# Altium schematic symbol library BARKO_SCHLIB.SchLib: 1064 symbols (part 8 of 11) (continued)
## Q-FQT2P25TF (continued)
MOSFET P-CH 250V 0.55A SOT-223; Manufacturer: ON Semiconductor / Fairchild; Element Configuration: Single; Drain to Source Breakdown Voltage: -250V; Gate to Source Voltage (Vgs): 30V; Rise Time: 40ns; Rds On Max: 4R; Input Capacitance: 250pF; Current Rating: -550mA; Fall Time: 25ns; Power Dissipation: 2.5W; Turn-Off Delay Time: 12ns; Turn-On Delay Time: 8.5ns; Number of Elements: 1; .Creator: M.OZKAN; .PCBCHK: USED; Supplier 1: Digi-Key; Supplier Part Number 1: FQT2P25TFCT-ND; Manufacturer Part Number: FQT2P25TF; Stock: 2064; Pricing: 1=0.6, 10=0.51, 25=0.4756, 100=0.3533, 250=0.3357, 500=0.2759, 1000=0.2242 (USD); RoHS: Yes; Mount: Surface Mount; Case/Package: SOT-223; Number of Pins: 4; Weight: 0.188g; Min Operating Temperature: -55°C; Max Operating Temperature: 150°C; Package Quantity: 4000; Packaging: Tape and Reel; Voltage Rating (DC): -250V; Drain to Source Resistance: 4R; Max Power Dissipation: 2.5W; Length: 6.7mm; Height: 1.8mm; Width: 3.7mm; Radiation Hardening: No; Lead Free: Lead Free; ComponentLink1URL: https://datasheet.ciiva.com/952/fqt2p25-952984.pdf?src-supplier=Digi-Key; ComponentLink1Description: https://datasheet.ciiva.com/952/fqt2p25-952984.pdf?src-supplier=Digi-Key; ComponentLink2URL: https://datasheet.ciiva.com/29750/fqt2p25-29750954.pdf?src-supplier=Digi-Key; ComponentLink2Description: https://datasheet.ciiva.com/29750/fqt2p25-29750954.pdf?src-supplier=Digi-Key; .SCHCHK: USED
footprint SOT223 (SOT,2.30mm pitch;4 pin,3.50mm W X 6.50mm L X 1.70mm H body)
pins: 1 GATE, 2 DRAIN, 3 SOURCE, 4 DRAIN
text: 2, 4

## Q-IAUA250N04S6N006AUMA1
designator Q?, comment IAUA250N04S6N006AUMA1
40V, N-Ch, 0.6 mΩ max, Automotive MOSFET, sTOLL, OptiMOS™-6; Manufacturer: Infineon; Supplier 1: Mouser; Supplier Part Number 1: 726-IAUA250N04S6N006; Manufacturer Part Number: IAUA250N04S6N006AUMA1; Stock: 1700; Pricing: 1=2.93, 10=2.49, 100=1.99, 500=1.77, 1000=1.52, 2000=1.48, 4000=1.43, 1=3.46, 10=2.94, 100=2.35, 500=2.09, 1000=1.79, 2000=1.75 (EUR); RoHS: No
footprint HSOF-5
pins: 1 S, 2 S, 3 S, 4 S, 5 G, 6 D

## Q-IRF4905PBF-TO220AB
designator Q?, comment IRF4905  Case/Package: TO-220AB
MOSFET P-CH 55V 74A TO-220AB; Manufacturer: International Rectifier; Manufacturer Part Number: IRF4905PBF; Rds On Max: 20mR; Input Capacitance: 3.4nF; Max Power Dissipation: 200W; Gate to Source Voltage (Vgs): 20V; Turn-On Delay Time: 18ns; Turn-Off Delay Time: 61ns; Drain to Source Breakdown Voltage: -55V; Element Configuration: Single; Recovery Time: 130ns; Nominal Vgs: -4V; Number of Elements: 1; Rise Time: 99ns; Fall Time: 96ns; Current Rating: -74A; .PCBCHK: USED; .Creator: F:TALI; Washability: OK; Supplier 1: Digi-Key; Supplier Part Number 1: IRF4905PBF-ND; Stock 1: 8270; Pricing 1: 1=1.9, 10=1.712, 100=1.3761, 500=1.0703, 1000=0.88682 (USD); Mount: Through Hole; Number of Pins: 3; Min Operating Temperature: -55°C; Max Operating Temperature: 175°C; Packaging: Rail/Tube; Drain to Source Voltage (Vdss): 55V; Continuous Drain Current (ID): 74A; Power Dissipation: 200W; Drain to Source Resistance: 20mR; Package Quantity: 50; Dual Supply Voltage: -55V; Termination: Through Hole; Voltage Rating (DC): -55V; Length: 10.54mm; Height: 8.77mm; Width: 4.69mm; Lead Pitch: 2.54mm; Radiation Hardening: No; REACH SVHC: No SVHC; Lead Free: Lead Free; ComponentLink1URL: http://www.irf.com/product-info/datasheets/data/irf4905pbf.pdf; ComponentLink1Description: http://www.irf.com/product-info/datasheets/data/irf4905pbf.pdf; ComponentLink2URL: https://www.distrelec.biz/Web/Downloads/ta/_e/cfIRF4905_Data_E.pdf?mime=application%2Fpdf; ComponentLink2Description: https://www.distrelec.biz/Web/Downloads/ta/_e/cfIRF4905_Data_E.pdf?mime=application%2Fpdf; ComponentLink3URL: https://www.verical.com/server-webapp/html/getDatasheet?partID=144801; ComponentLink3Description: https://www.verical.com/server-webapp/html/getDatasheet?partID=144801; ComponentLink4URL: http://www.farnell.com/datasheets/2043028.pdf; ComponentLink4Description: http://www.farnell.com/datasheets/2043028.pdf; ComponentLink5URL: http://www.mouser.com/ds/2/200/irf4905pbf-220585.pdf; ComponentLink5Description: http://www.mouser.com/ds/2/200/irf4905pbf-220585.pdf; ComponentLink6URL: http://www.jameco.com/Jameco/Products/ProdDS/1559851.pdf; ComponentLink6Description: http://www.jameco.com/Jameco/Products/ProdDS/1559851.pdf; .SCHCHK: USED
footprint TO-220AB
pins: 1 G, 2 S, 3 D

## Q-IRFL110TRPBF
designator Q?, comment IRFL110TRPBF
MOSFET N-CH 100V 1.5A SOT223; Manufacturer: Vishay; Max Power Dissipation: 2W; Rise Time: 16ns; Input Capacitance: 180pF; Number of Elements: 1; Rds On Max: 540mR; Gate to Source Voltage (Vgs): 20V; Fall Time: 9.4ns; Turn-Off Delay Time: 15ns; Turn-On Delay Time: 6.9ns; Element Configuration: Single; Current: 15A; Washability: OK; .Creator: M.OZKAN; .PCBCHK: USED; Supplier 1: Digi-Key; Manufacturer Part Number: IRFL110TRPBF; Stock 1: 6113; Pricing 1: 1=0.72000, 10=0.63500, 100=0.48650, 500=0.38460, 1000=0.30768 (USD); RoHS: Yes; Mount: Surface Mount; Case/Package: SOT-223; Number of Pins: 3; Weight: 0.008826oz; Contact Plating: Tin,Matte; Min Operating Temperature: -55°C; Max Operating Temperature: 150°C; Drain to Source Voltage (Vdss): 100V; Continuous Drain Current (ID): 1.5A; Drain to Source Breakdown Voltage: 100V; Power Dissipation: 2W; Package Quantity: 1; Packaging: Tape and Reel; Drain to Source Resistance: 540mR; Number of Channels: 1; Voltage: 100V; On-State Resistance: 540mR; Length: 6.7mm; Height: 1.8mm; Width: 3.7mm; Radiation Hardening: No; REACH SVHC: Unknown; Lead Free: Lead Free; ComponentLink1URL: https://datasheet.ciiva.com/30479/0900766b8126cec6-30479774.pdf?src-supplier=RSComponents; ComponentLink1Description: https://datasheet.ciiva.com/30479/0900766b8126cec6-30479774.pdf?src-supplier=RSComponents; ComponentLink2URL: https://datasheet.ciiva.com/34302/1562152-34302494.pdf?src-supplier=Jameco; ComponentLink2Description: https://datasheet.ciiva.com/34302/1562152-34302494.pdf?src-supplier=Jameco; ComponentLink3URL: https://datasheet.ciiva.com/15137/getdatasheetpartid-80948-15137530.pdf?src-supplier=Verical; ComponentLink3Description: https://datasheet.ciiva.com/15137/getdatasheetpartid-80948-15137530.pdf?src-supplier=Verical; ComponentLink4URL: https://datasheet.ciiva.com/23729/1759753-23729811.pdf?src-supplier=Newark; ComponentLink4Description: https://datasheet.ciiva.com/23729/1759753-23729811.pdf?src-supplier=Newark; ComponentLink5URL: https://datasheet.ciiva.com/26789/irfl110trpbf-26789754.pdf?src-supplier=IIIC; ComponentLink5Description: https://datasheet.ciiva.com/26789/irfl110trpbf-26789754.pdf?src-supplier=IIIC; ComponentLink6URL: https://datasheet.ciiva.com/26147/sihfl110-26147656.pdf?src-supplier=Avnet+Europe; ComponentLink6Description: https://datasheet.ciiva.com/26147/sihfl110-26147656.pdf?src-supplier=Avnet+Europe; ComponentLink7URL: https://datasheet.ciiva.com/6387/sihfl110-6387838.pdf?src-supplier=Digi-Key; ComponentLink7Description: https://datasheet.ciiva.com/6387/sihfl110-6387838.pdf?src-supplier=Digi-Key; ComponentLink8URL: https://datasheet.ciiva.com/11161/sihfl110-11161625.pdf?src-supplier=Avnet; ComponentLink8Description: https://datasheet.ciiva.com/11161/sihfl110-11161625.pdf?src-supplier=Avnet; ComponentLink9URL: https://datasheet.ciiva.com/6387/sihfl110-6387836.pdf?src-supplier=Digi-Key; ComponentLink9Description: https://datasheet.ciiva.com/6387/sihfl110-6387836.pdf?src-supplier=Digi-Key; ComponentLink10URL: https://datasheet.ciiva.com/16363/sihfl110-16363717.pdf?src-supplier=Future+Electronics; ComponentLink10Description: https://datasheet.ciiva.com/16363/sihfl110-16363717.pdf?src-supplier=Future+Electronics; Supplier Part Number 1: IRFL110PBFCT-ND; .SCHCHK: USED
footprint SOT223 (SOT,2.30mm pitch;4 pin,3.50mm W X 6.50mm L X 1.70mm H body)
pins: 1 GATE, 2 DRAIN, 3 SOURCE, 4 DRAIN
text: 2, 4

## Q-IRFS4321TRL7PP
designator Q?, comment IRFS4321  Rds On Max: 14.7mR  Drain to Source Voltage (Vdss): 150V  Continuous Drain Current (ID): 86A
MOSFET N-CH 150V 86A D2PAK; Manufacturer: International Rectifier; Manufacturer Part Number: IRFS4321TRL7PP; Input Capacitance: 4.46nF; Rise Time: 60ns; Max Power Dissipation: 350W; Turn-On Delay Time: 18ns; Turn-Off Delay Time: 25ns; Fall Time: 35ns; Threshold Voltage: 5V; Gate to Source Voltage (Vgs): 30V; Element Configuration: Single; Number of Channels: 1; Drain to Source Resistance: 11.7mR; Washability: OK; .Creator: M.OZKAN; .PCBCHK: USED; Supplier 1: Digi-Key; Stock 1: 0; Pricing 1: 800=1.87600 (USD); RoHS: Yes; Mount: Surface Mount; Case/Package: TO-263-7; Number of Pins: 7; Weight: 0.056438oz; Min Operating Temperature: -55°C; Max Operating Temperature: 175°C; Packaging: Tape and Reel; Package Quantity: 800; Radiation Hardening: No; REACH SVHC: No SVHC; Lead Free: Lead Free; ComponentLink1URL: https://datasheet.ciiva.com/29745/irfs4321-7ppbf-29745000.pdf?src-supplier=Digi-Key; ComponentLink1Description: https://datasheet.ciiva.com/29745/irfs4321-7ppbf-29745000.pdf?src-supplier=Digi-Key; ComponentLink2URL: https://datasheet.ciiva.com/46443/1807912-46443958.pdf?src-supplier=Element14; ComponentLink2Description: https://datasheet.ciiva.com/46443/1807912-46443958.pdf?src-supplier=Element14; Supplier Part Number 1: IRFS4321TRL7PPTR-ND; .SCHCHK: USED
footprint D2PAK-7
pins: 1 G, 2 S, 3 S, 4 D, 5 S, 6 S, 7 S

## Q-IRLZ44NPBF-TO220AB
designator Q?, comment IRLZ44NPBF  Case/Package: TO-220AB
MOSFET N-CH 55V 47A TO-220AB; Manufacturer: International Rectifier; Rise Time: 84ns; Gate to Source Voltage (Vgs): 16V; Turn-On Delay Time: 11ns; Turn-Off Delay Time: 26ns; Fall Time: 15ns; Input Capacitance: 1.7nF; Max Power Dissipation: 110W; Number of Elements: 1; Rds On Max: 22mR; Drain to Source Resistance: 35mR; Nominal Vgs: 2V; Recovery Time: 120ns; Element Configuration: Single; .Creator: F:TALI; .PCBCHK: USED; Washability: OK; Supplier 1: Digi-Key; Manufacturer Part Number: IRLZ44NPBF; Stock 1: 4446; Pricing 1: 1=1.19, 10=1.052, 100=0.8314, 500=0.64476, 1000=0.50903 (USD); Mount: Through Hole; Number of Pins: 3; Min Operating Temperature: -55°C; Max Operating Temperature: 175°C; Continuous Drain Current (ID): 47A; Package Quantity: 50; Packaging: Rail/Tube; Drain to Source Breakdown Voltage: 55V; Power Dissipation: 110W; Drain to Source Voltage (Vdss): 55V; On-State Resistance: 22mR; Dual Supply Voltage: 55V; Voltage Rating (DC): 55V; Current Rating: 47A; Length: 10.54mm; Height: 8.77mm; Width: 4.69mm; Lead Pitch: 2.54mm; Radiation Hardening: No; Lead Free: Lead Free; REACH SVHC: No SVHC; ComponentLink1URL: http://www.jameco.com/Jameco/Products/ProdDS/1563905.pdf?src-supplier=Jameco; ComponentLink1Description: http://www.jameco.com/Jameco/Products/ProdDS/1563905.pdf?src-supplier=Jameco; ComponentLink2URL: http://www.mouser.com/ds/2/200/irlz44npbf-222956.pdf?src-supplier=Mouser; ComponentLink2Description: http://www.mouser.com/ds/2/200/irlz44npbf-222956.pdf?src-supplier=Mouser; ComponentLink3URL: http://www.alliedelec.com/m/d/836a017d84d7b539fecc6816ad6505f3.pdf?src-supplier=Allied+Electronics; ComponentLink3Description: http://www.alliedelec.com/m/d/836a017d84d7b539fecc6816ad6505f3.pdf?src-supplier=Allied+Electronics; ComponentLink4URL: http://www.irf.com/product-info/datasheets/data/irlz44npbf.pdf?src-supplier=Element14; ComponentLink4Description: http://www.irf.com/product-info/datasheets/data/irlz44npbf.pdf?src-supplier=Element14; ComponentLink5URL: https://www.distrelec.biz/Web/Downloads/ta/_e/llIRLZ44N_Data_E.pdf?mime=application%2Fpdf&src-supplier=Distrelec; ComponentLink5Description: https://www.distrelec.biz/Web/Downloads/ta/_e/llIRLZ44N_Data_E.pdf?mime=application%2Fpdf&src-supplier=Distrelec; ComponentLink6URL: http://www.irf.com/product-info/datasheets/data/irlz44npbf.pdf?src-supplier=Avnet; ComponentLink6Description: http://www.irf.com/product-info/datasheets/data/irlz44npbf.pdf?src-supplier=Avnet; ComponentLink7URL: http://www.irf.com/product-info/datasheets/data/irlz44npbf.pdf?src-supplier=Digi-Key; ComponentLink7Description: http://www.irf.com/product-info/datasheets/data/irlz44npbf.pdf?src-supplier=Digi-Key; ComponentLink8URL: http://www.irf.com/product-info/datasheets/data/irlz44npbf.pdf?src-supplier=Future+Electronics; ComponentLink8Description: http://www.irf.com/product-info/datasheets/data/irlz44npbf.pdf?src-supplier=Future+Electronics; ComponentLink9URL: https://www.verical.com/server-webapp/html/getDatasheet?partID=94379&src-supplier=Verical; ComponentLink9Description: https://www.verical.com/server-webapp/html/getDatasheet?partID=94379&src-supplier=Verical; Supplier Part Number 1: IRLZ44NPBF-ND; .SCHCHK: USED
footprint TO-220_OUTLINE
pins: 1, 2, 3

## Q-IRLZ44NSTRLPBF
designator Q?, comment IRLZ44NSTRLPBF  Case/Package: D2PAK
MOSFET N-CH 55V 47A D2PAK; Manufacturer: International Rectifier; Gate to Source Voltage (Vgs): 16V; Turn-On Delay Time: 11ns; Turn-Off Delay Time: 26ns; Rds On Max: 22mR; Input Capacitance: 1.7nF; Rise Time: 84ns; Element Configuration: Single; Max Power Dissipation: 110W; Drain to Source Resistance: 35mR; Power Dissipation: 3.8W; Fall Time: 15ns; Threshold Voltage: 2V; Number of Elements: 1; .Creator: F:TALI; .PCBCHK: USED; Washability: OK; Supplier 1: Mouser; Manufacturer Part Number: IRLZ44NSTRLPBF; Stock 1: 794; Pricing 1: 1=1.31, 10=1.12, 50=1.12, 100=0.861, 1000=0.6, 10000=0.6 (USD); Mount: Surface Mount; Number of Pins: 3; Min Operating Temperature: -55°C; Max Operating Temperature: 175°C; Continuous Drain Current (ID): 47A; Packaging: Tape and Reel; Drain to Source Voltage (Vdss): 55V; Drain to Source Breakdown Voltage: 55V; Package Quantity: 1; Voltage Rating (DC): 55V; Current Rating: 47A; On-State Resistance: 22mR; Length: 10.67mm; Height: 4.83mm; Width: 9.65mm; Radiation Hardening: No; REACH SVHC: Unknown; Lead Free: Lead Free; ComponentLink1URL: http://www.irf.com/product-info/datasheets/data/irlz44ns.pdf?src-supplier=Digi-Key; ComponentLink1Description: http://www.irf.com/product-info/datasheets/data/irlz44ns.pdf?src-supplier=Digi-Key; ComponentLink2URL: https://www.verical.com/server-webapp/html/getDatasheet?partID=79588&src-supplier=Verical; ComponentLink2Description: https://www.verical.com/server-webapp/html/getDatasheet?partID=79588&src-supplier=Verical; ComponentLink3URL: http://www.irf.com/product-info/datasheets/data/irlz44nspbf.pdf?src-supplier=Avnet; ComponentLink3Description: http://www.irf.com/product-info/datasheets/data/irlz44nspbf.pdf?src-supplier=Avnet; ComponentLink4URL: http://www.alliedelec.com/images/products/datasheets/bm/INTERNATIONAL_RECTIFIER/70017122.pdf?src-supplier=Allied+Electronics; ComponentLink4Description: http://www.alliedelec.com/images/products/datasheets/bm/INTERNATIONAL_RECTIFIER/70017122.pdf?src-supplier=Allied+Electronics; ComponentLink5URL: http://www.irf.com/product-info/datasheets/data/irlz44ns.pdf?src-supplier=Element14; ComponentLink5Description: http://www.irf.com/product-info/datasheets/data/irlz44ns.pdf?src-supplier=Element14; ComponentLink6URL: http://www.jameco.com/Jameco/Products/ProdDS/2035442.pdf?src-supplier=Jameco; ComponentLink6Description: http://www.jameco.com/Jameco/Products/ProdDS/2035442.pdf?src-supplier=Jameco; ComponentLink7URL: http://www.irf.com/product-info/datasheets/data/irlz44nspbf.pdf?src-supplier=Avnet+Europe; ComponentLink7Description: http://www.irf.com/product-info/datasheets/data/irlz44nspbf.pdf?src-supplier=Avnet+Europe; Supplier Part Number 1: 942-IRLZ44NSTRLPBF; .SCHCHK: USED
footprint D2PAK-TO-263
pins: 1 G, 2 S, 3 D

## Q-IXFA12N50P
designator Q?, comment IXFA12N50P
MOSFET N-CH 500V 12A D2-PAK; Manufacturer: IXYS; Element Configuration: Single; Gate to Source Voltage (Vgs): 30V; Rds On Max: 500mR; Input Capacitance: 1.83nF; Rise Time: 27ns; Max Power Dissipation: 200W; Fall Time: 20ns; Turn-Off Delay Time: 65ns; Number of Elements: 1; Supplier 1: Mouser; Supplier Part Number 1: 747-IXFA12N50P; Manufacturer Part Number: IXFA12N50P; Stock: 1059; Pricing: 1=2.75, 10=2.33, 100=1.87, 500=1.66, 1000=1.44, 2500=1.39 (USD); RoHS: Yes; Mount: Surface Mount; Case/Package: TO-263; Min Operating Temperature: -55°C; Max Operating Temperature: 150°C; Package Quantity: 50; Packaging: Rail/Tube; Voltage Rating (DC): 500V; Current Rating: 12A; Drain to Source Voltage (Vdss): 500V; Continuous Drain Current (ID): 12A; Drain to Source Breakdown Voltage: 500V; Power Dissipation: 200W; Drain to Source Resistance: 500mR; Radiation Hardening: No; Lead Free: Lead Free; ComponentLink1URL: https://datasheet.ciiva.com/26948/getdatasheetpartid-754491-26948596.pdf?src-supplier=Verical; ComponentLink1Description: https://datasheet.ciiva.com/26948/getdatasheetpartid-754491-26948596.pdf?src-supplier=Verical
footprint D2PAK-TO-263
pins: 1 G, 2 S, 3 D

## Q-IXFT170N25X3HV
designator Q?, comment IXFT170N25X3HV
MOSFET N-CH 250V 170A TO268HV; Manufacturer: IXYS; Rds On Max: 7.4mR; Input Capacitance: 13.5nF; Max Power Dissipation: 960W; Supplier 1: Digi-Key; Manufacturer Part Number: IXFT170N25X3HV; Stock 1: 411; Pricing 1: 1=14,34000, 10=13,18200, 25=12,63560, 100=10,92800, 500=9,90350, 1000=9,08390, 2500=8,53750, 5000=8,19600 (USD); RoHS: No; Mount: Surface Mount; Min Operating Temperature: -55°C; Max Operating Temperature: 150°C; Packaging: Rail/Tube; Drain to Source Voltage (Vdss): 250V; Continuous Drain Current (ID): 170A; ComponentLink1URL: http://ixapps.ixys.com/DataSheet/DS100809C(IXFT-FH--FK170N25X3-HV_).pdf?src-supplier=Digi-Key; ComponentLink1Description: http://ixapps.ixys.com/DataSheet/DS100809C(IXFT-FH--FK170N25X3-HV_).pdf?src-supplier=Digi-Key; Case/Package: TO-268-3; Supplier Part Number 1: IXFT170N25X3HV-ND
footprint TO-268AA
pins: 1 G, 2 S, 3 D

## Q-IXTA44P15TTRL
designator Q?, comment IXTA44P15TTRL
MOSFET P-CH 150V 44A TO-263; Manufacturer: IXYS; Rds On Max: 65mR; Input Capacitance: 13.4nF; Max Power Dissipation: 298W; .Creator: F:TALI; .PCBCHK: USED; Washability: OK; Supplier 1: Digi-Key; Supplier Part Number 1: IXTA44P15TTRLDKR-ND; Manufacturer Part Number: IXTA44P15TTRL; Stock 1: 2743; Pricing 1: 1=5.05, 10=4.506, 100=3.6951 (USD); Mount: Surface Mount; Case/Package: TO-263-4; Min Operating Temperature: -55°C; Max Operating Temperature: 150°C; Package Quantity: 800; Packaging: Tape and Reel; Drain to Source Voltage (Vdss): 150V; Continuous Drain Current (ID): 44A; Lead Free: Lead Free; ComponentLink1URL: http://ixapps.ixys.com/DataSheet/DS100023B(IXTA-TH-TQ-TP44P15T).pdf?src-supplier=Digi-Key; ComponentLink1Description: http://ixapps.ixys.com/DataSheet/DS100023B(IXTA-TH-TQ-TP44P15T).pdf?src-supplier=Digi-Key; .SCHCHK: USED
footprint D2PAK-TO-263
pins: 1 G, 2 S, 3 D

## Q-MCT06P10-TP
designator Q?, comment MCT06P10
P-channel MOSFET SOT-223; Manufacturer: MCC; Manufacturer Part Number: MCT06P10-TP; Washability: OK; .Creator: M.OZKAN; .PCBCHK: USED; Supplier 1: Digi-Key; Stock 1: 29944; Pricing 1: 1=0.59000, 10=0.49400, 100=0.37080, 500=0.27192, 1000=0.21012 (USD); RoHS: No; Supplier Part Number 1: MCT06P10-TPMSCT-ND; .SCHCHK: USED
footprint SOT223 (SOT,2.30mm pitch;4 pin,3.50mm W X 6.50mm L X 1.70mm H body)
pins: 1 GATE, 2 DRAIN, 3 SOURCE, 4 DRAIN
text: 2, 4

## Q-MMBT5550L
designator Q, comment MMBT5550L  Case/Package: SOT-23-3  Supplier Part Number 1: MMBT5550LT1GOSCT-ND
TRANS NPN 160V 600mA; Manufacturer: ON Semiconductor; Manufacturer Part Number 1: MMBT5550LT1G; Max Power Dissipation: 225mW; Collector Emitter Voltage (VCEO): 140V; hFE Min: 60; Emitter Base Voltage (VEBO): 6V; Collector Emitter Saturation Voltage: 150mV; Element Configuration: Single; Number of Elements: 1; Power Dissipation: 300mW; Supplier 1: Digi-Key; Stock 1: 125354; Pricing 1: 1=0,18000, 10=0,16400, 25=0,15640, 100=0,06880, 500=0,05400, 1000=0,03750 (USD); RoHS: Yes; Number of Pins: 3; Weight: 0.01lb; Contact Plating: Tin,Matte; Min Operating Temperature: -55°C; Max Operating Temperature: 150°C; Package Quantity: 1; Packaging: Tape and Reel; Max Collector Current: 600mA; Collector Emitter Breakdown Voltage: 140V; Polarity: NPN; Collector Base Voltage (VCBO): 160V; Voltage Rating (DC): 140V; Current Rating: 600mA; Max Breakdown Voltage: 140V; Type: General Purpose; Length: 3.04mm; Height: 1.01mm; Width: 1.4mm; Radiation Hardening: No; Lead Free: Lead Free; REACH SVHC: No SVHC; ComponentLink1URL: https://datasheet.ciiva.com/30480/0900766b81276ae6-30480440.pdf?src-supplier=RSComponents; ComponentLink1Description: https://datasheet.ciiva.com/30480/0900766b81276ae6-30480440.pdf?src-supplier=RSComponents; ComponentLink2URL: https://datasheet.ciiva.com/15139/getdatasheetpartid-82697-15139081.pdf?src-supplier=Verical; ComponentLink2Description: https://datasheet.ciiva.com/15139/getdatasheetpartid-82697-15139081.pdf?src-supplier=Verical; ComponentLink3URL: https://datasheet.ciiva.com/976/mmbt5550lt1-d-976514.pdf?src-supplier=Digi-Key; ComponentLink3Description: https://datasheet.ciiva.com/976/mmbt5550lt1-d-976514.pdf?src-supplier=Digi-Key; ComponentLink4URL: https://datasheet.ciiva.com/976/mmbt5550lt1-d-976515.pdf?src-supplier=Digi-Key; ComponentLink4Description: https://datasheet.ciiva.com/976/mmbt5550lt1-d-976515.pdf?src-supplier=Digi-Key; ComponentLink5URL: https://datasheet.ciiva.com/976/mmbt5550lt1-d-976516.pdf?src-supplier=Digi-Key; ComponentLink5Description: https://datasheet.ciiva.com/976/mmbt5550lt1-d-976516.pdf?src-supplier=Digi-Key; ComponentLink6URL: https://datasheet.ciiva.com/16478/mmbt5550lt1-d-16478566.pdf?src-supplier=Avnet+Asia; ComponentLink6Description: https://datasheet.ciiva.com/16478/mmbt5550lt1-d-16478566.pdf?src-supplier=Avnet+Asia; ComponentLink7URL: https://datasheet.ciiva.com/16202/mmbt5550lt1-d-16202395.pdf?src-supplier=Future+Electronics; ComponentLink7Description: https://datasheet.ciiva.com/16202/mmbt5550lt1-d-16202395.pdf?src-supplier=Future+Electronics; ComponentLink8URL: https://datasheet.ciiva.com/7972/mmbt5550lt1-d-7972397.pdf?src-supplier=Element14; ComponentLink8Description: https://datasheet.ciiva.com/7972/mmbt5550lt1-d-7972397.pdf?src-supplier=Element14
footprint SOT23-3
pins: 1, 2, 3

## Q-MMBTA06
designator Q?, comment MMBTA06  Case/Package: SOT-23-3
TRANS NPN 80V 0.5A SOT23; Manufacturer: ON Semiconductor; Manufacturer Part Number: MMBTA06LT1G; .Creator: F:TALI; .PCBCHK: USED; Max Power Dissipation: 225mW; Number of Elements: 1; Frequency: 100MHz; Emitter Base Voltage (VEBO): 4V; Collector Emitter Saturation Voltage: 250mV; Max Collector Current: 500mA; Power Dissipation: 300mW; Element Configuration: Single; hFE Min: 100; ComponentLink1URL: http://www.fairchildsemi.com/ds/MM/MMBTA06.pdf; ComponentLink1Description: http://www.fairchildsemi.com/ds/MM/MMBTA06.pdf; ComponentLink2URL: http://www.farnell.com/datasheets/48137.pdf; ComponentLink2Description: http://www.farnell.com/datasheets/48137.pdf; ComponentLink3URL: http://www.farnell.com/datasheets/1852077.pdf; ComponentLink3Description: http://www.farnell.com/datasheets/1852077.pdf; ComponentLink4URL: http://www.fairchildsemi.com/datasheets/MP/MPSA06.pdf; ComponentLink4Description: http://www.fairchildsemi.com/datasheets/MP/MPSA06.pdf; ComponentLink5URL: http://www.mouser.com/ds/2/149/MMBTA06-196120.pdf; ComponentLink5Description: http://www.mouser.com/ds/2/149/MMBTA06-196120.pdf; ComponentLink6URL: https://www.verical.com/server-webapp/html/getDatasheet?partID=130058; ComponentLink6Description: https://www.verical.com/server-webapp/html/getDatasheet?partID=130058; .SCHCHK: USED; Supplier 1: Digi-Key; Supplier Part Number 1: MMBTA06LT1GOSCT-ND; Stock: 165416; Pricing: 1=0.16, 10=0.15, 25=0.1424, 100=0.0627, 250=0.0602, 500=0.0492, 1000=0.0342 (USD); RoHS: Yes; Number of Pins: 3; Contact Plating: Tin,Matte; Min Operating Temperature: -55°C; Max Operating Temperature: 150°C; Package Quantity: 1; Collector Emitter Voltage (VCEO): 80V; Packaging: Tape and Reel; Polarity: NPN; Collector Base Voltage (VCBO): 80V; Collector Emitter Breakdown Voltage: 80V; Transition Frequency: 100MHz; Max Breakdown Voltage: 80V; Max Frequency: 100MHz; Gain Bandwidth Product: 100MHz; Voltage Rating (DC): 80V; Current Rating: 500mA; Length: 0.119inch; Height: 0.04inch; Width: 0.055inch; Radiation Hardening: No; REACH SVHC: No SVHC; Lead Free: Lead Free; ComponentLink7URL: https://datasheet.ciiva.com/4722/mmbta05lt1-d-101659-4722113.pdf?src-supplier=Mouser; ComponentLink7Description: https://datasheet.ciiva.com/4722/mmbta05lt1-d-101659-4722113.pdf?src-supplier=Mouser; ComponentLink8URL: https://datasheet.ciiva.com/15139/getdatasheetpartid-137838-15139444.pdf?src-supplier=Verical; ComponentLink8Description: https://datasheet.ciiva.com/15139/getdatasheetpartid-137838-15139444.pdf?src-supplier=Verical; ComponentLink9URL: https://datasheet.ciiva.com/16465/mmbta05lt1-d-16465685.pdf?src-supplier=Future+Electronics; ComponentLink9Description: https://datasheet.ciiva.com/16465/mmbta05lt1-d-16465685.pdf?src-supplier=Future+Electronics; ComponentLink10URL: https://datasheet.ciiva.com/11197/mmbta05lt1-d-11197414.pdf?src-supplier=Avnet; ComponentLink10Description: https://datasheet.ciiva.com/11197/mmbta05lt1-d-11197414.pdf?src-supplier=Avnet; ComponentLink11URL: https://datasheet.ciiva.com/11198/mmbta05lt1-d-11198678.pdf?src-supplier=Avnet; ComponentLink11Description: https://datasheet.ciiva.com/11198/mmbta05lt1-d-11198678.pdf?src-supplier=Avnet; ComponentLink12URL: https://datasheet.ciiva.com/976/mmbta05lt1-d-976473.pdf?src-supplier=Digi-Key; ComponentLink12Description: https://datasheet.ciiva.com/976/mmbta05lt1-d-976473.pdf?src-supplier=Digi-Key; ComponentLink13URL: https://datasheet.ciiva.com/976/mmbta05lt1-d-976474.pdf?src-supplier=Digi-Key; ComponentLink13Description: https://datasheet.ciiva.com/976/mmbta05lt1-d-976474.pdf?src-supplier=Digi-Key; ComponentLink14URL: https://datasheet.ciiva.com/976/mmbta05lt1-d-976475.pdf?src-supplier=Digi-Key; ComponentLink14Description: https://datasheet.ciiva.com/976/mmbta05lt1-d-976475.pdf?src-supplier=Digi-Key; ComponentLink15URL: https://datasheet.ciiva.com/7972/mmbta05lt1-d-7972078.pdf?src-supplier=Element14; ComponentLink15Description: https://datasheet.ciiva.com/7972/mmbta05lt1-d-7972078.pdf?src-supplier=Element14; ComponentLink16URL: https://datasheet.ciiva.com/16478/mmbta05lt1-d-16478574.pdf?src-supplier=Avnet+Asia; ComponentLink16Description: https://datasheet.ciiva.com/16478/mmbta05lt1-d-16478574.pdf?src-supplier=Avnet+Asia; ComponentLink17URL: https://datasheet.ciiva.com/25998/mmbta05lt1-d-25998830.pdf?src-supplier=Avnet+Europe; ComponentLink17Description: https://datasheet.ciiva.com/25998/mmbta05lt1-d-25998830.pdf?src-supplier=Avnet+Europe
footprint SOT23-3
pins: 1, 2, 3

## Q-MMBTA56LT1G
designator Q?, comment MMBTA56LT1G  Case/Package: SOT-23-3
TRANS PNP 80V 0.5A SOT23; Manufacturer: ON Semiconductor; Max Power Dissipation: 225mW; Number of Elements: 1; Frequency: 50MHz; hFE Min: 100; Emitter Base Voltage (VEBO): 4V; Max Collector Current: 500mA; Collector Emitter Breakdown Voltage: -80V; Collector Emitter Saturation Voltage: -250mV; Power Dissipation: 300mW; Element Configuration: Single; Current Rating: -500mA; .Creator: F:TALI; .PCBCHK: USED; Washability: OK; Supplier 1: Digi-Key; Manufacturer Part Number: MMBTA56LT1G; Stock 1: 65303; Pricing 1: 1=0.22, 10=0.203, 100=0.1106, 500=0.06806, 1000=0.0464 (USD); Number of Pins: 3; Contact Plating: Matte,Tin; Min Operating Temperature: -55°C; Max Operating Temperature: 150°C; Package Quantity: 1; Collector Emitter Voltage (VCEO): 80V; Packaging: Tape and Reel; Polarity: PNP; Transition Frequency: 50MHz; Max Breakdown Voltage: 80V; Collector Base Voltage (VCBO): 80V; Gain Bandwidth Product: 50MHz; Max Frequency: 50MHz; Voltage Rating (DC): -80V; Length: 0.119inch; Height: 0.04inch; Width: 0.055inch; Radiation Hardening: No; Lead Free: Lead Free; REACH SVHC: No SVHC; ComponentLink1URL: https://www.verical.com/server-webapp/html/getDatasheet?partID=99524; ComponentLink1Description: https://www.verical.com/server-webapp/html/getDatasheet?partID=99524; ComponentLink2URL: http://www.mouser.com/ds/2/308/MMBTA55LT1-D-112284.pdf; ComponentLink2Description: http://www.mouser.com/ds/2/308/MMBTA55LT1-D-112284.pdf; ComponentLink3URL: http://www.farnell.com/datasheets/1571910.pdf; ComponentLink3Description: http://www.farnell.com/datasheets/1571910.pdf; ComponentLink4URL: http://www.onsemi.com/pub/Collateral/MMBTA55LT1-D.PDF; ComponentLink4Description: http://www.onsemi.com/pub/Collateral/MMBTA55LT1-D.PDF; Supplier Part Number 1: MMBTA56LT1GOSDKR-ND; .SCHCHK: USED
footprint SOT23-3
pins: 1, 2, 3

## Q-NTBLS0D7N06C
designator Q, comment NTBLS0D7N06C  Supplier Part Number 1: 488-NTBLS0D7N06CCT-ND
NFET TOLL 60V 0.75MO; Manufacturer: ON Semiconductor; Supplier 1: Digi-Key; Manufacturer Part Number: NTBLS0D7N06C; Stock 1: 1954; Pricing 1: 1=5,41000, 10=4,85500, 25=4,59000, 100=3,67200, 500=3,26400, 1000=2,79480 (USD); RoHS: No; Supplier 2: Digi-Key; Manufacturer Part Number 2: NTBLS0D7N06C; Stock 2: 1954; Pricing 2: 1=5,41000, 10=4,85500, 25=4,59000, 100=3,67200, 500=3,26400, 1000=2,79480 (USD)
footprint 8-PowerSFN
pins: 1 GATE, 2 SOURCE, 3 SOURCE, 4 SOURCE, 5 SOURCE, 6 SOURCE, 7 SOURCE, 8 SOURCE, 9 DRAIN

## Q-NTMTS0D6N04CL
designator Q?, comment NTMTS0D6N04CL
N-Channel 40V 554.5A 5W; Manufacturer: ON Semiconductor; Manufacturer Part Number: NTMTS0D6N04CLTXG; Supplier 1: Digi-Key; Stock 1: 2803; Pricing 1: 1=4,40000, 10=3,95000, 25=3,73400, 100=2,98730, 500=2,65536, 1000=2,27365 (USD); RoHS: No; Supplier Part Number 1: NTMTS0D6N04CLTXGOSCT-ND
footprint PQFN 8x8
pins: 1 G, 2 S, 3 S, 4 S, 5 D, 6 D, 7 D, 8 D

## Q-NVTFS6H850NTAG
designator Q?, comment NVTFS6H850
MOSFET N-CH 80V 68A TRENCH 8WDFN; Manufacturer: ON Semiconductor; Manufacturer Part Number: NVTFS6H850NTAG; Rds On Max: 9.5mR; Input Capacitance: 1.14nF; Max Power Dissipation: 107W; Supplier 1: Digi-Key; Supplier Part Number 1: NVTFS6H850NTAGOSCT-ND; Stock: 1154; Pricing: 1=0.93, 10=0.819, 25=0.7696, 100=0.5587, 500=0.4668 (USD); Mount: Surface Mount; Number of Pins: 8; Min Operating Temperature: -55°C; Max Operating Temperature: 175°C; Packaging: Cut Tape; Drain to Source Voltage (Vdss): 80V; Continuous Drain Current (ID): 68A; ComponentLink1URL: https://www.onsemi.com/pub/Collateral/NVTFS6H850N-D.PDF?src-supplier=Digi-Key; ComponentLink1Description: https://www.onsemi.com/pub/Collateral/NVTFS6H850N-D.PDF?src-supplier=Digi-Key; ComponentLink2URL: http://datasheet.octopart.com/NVTFS6H850NTAG-ON-Semiconductor-datasheet-139013616.pdf?src-supplier=ON+Semiconductor; ComponentLink2Description: http://datasheet.octopart.com/NVTFS6H850NTAG-ON-Semiconductor-datasheet-139013616.pdf?src-supplier=ON+Semiconductor; ComponentLink3URL: http://datasheet.octopart.com/NVTFS6H850NTAG-ON-Semiconductor-datasheet-86803066.pdf?src-supplier=ON+Semiconductor; ComponentLink3Description: http://datasheet.octopart.com/NVTFS6H850NTAG-ON-Semiconductor-datasheet-86803066.pdf?src-supplier=ON+Semiconductor; ComponentLink4URL: http://datasheet.octopart.com/NVTFS6H850NTAG-ON-Semiconductor-datasheet-101611421.pdf?src-supplier=Farnell; ComponentLink4Description: http://datasheet.octopart.com/NVTFS6H850NTAG-ON-Semiconductor-datasheet-101611421.pdf?src-supplier=Farnell
footprint 8-PowerWDFN (DFN, 8-Leads, Body 3.05x3.05mm, Pitch 0.65mm)
pins: 1 S, 2 S, 3 S, 4 G, 5 D, 6 D, 7 D, 8 D

## Q-PMN30XP
designator Q?, comment PMN30XP
MOSFET P-CH 20V 5.2A 6TSOP; Manufacturer: NXP Semiconductors; Manufacturer Part Number 1: PMN30XPX; Max Power Dissipation: 550mW; Rds On Max: 34mR; Input Capacitance: 1.575nF; Supplier 1: Digi-Key; Stock 1: 16739; Pricing 1: 1=0,43000, 10=0,34800, 25=0,31840, 100=0,19980, 500=0,18500, 1000=0,12580 (USD); RoHS: Yes; Mount: Surface Mount; Min Operating Temperature: -55°C; Max Operating Temperature: 150°C; Drain to Source Voltage (Vdss): 20V; Continuous Drain Current (ID): 5.2A; Packaging: Tape and Reel; ComponentLink1URL: https://assets.nexperia.com/documents/data-sheet/PMN30XP.pdf?src-supplier=Digi-Key; ComponentLink1Description: https://assets.nexperia.com/documents/data-sheet/PMN30XP.pdf?src-supplier=Digi-Key; Case/Package: TSOP; Supplier Part Number 1: 1727-2699-1-ND
footprint TSOP6
pins: 1 DRAIN, 2 DRAIN, 3 GATE, 4 SOURCE, 5 DRAIN, 6 DRAIN
text: 1,2,5,6

## Q-PMV213SN-SOT23
designator Q?, comment PMV213SN  Case/Package: SOT23
MOSFET N-CH 100V 1.9A SOT23; Manufacturer: NXP Semiconductors; Manufacturer Part Number: PMV213SN,215; Input Capacitance: 330pF; Max Power Dissipation: 2W; Rds On Max: 250mR; Rise Time: 5ns; Fall Time: 3ns; Turn-Off Delay Time: 9.5ns; Turn-On Delay Time: 5.5ns; Element Configuration: Single; Gate to Source Voltage (Vgs): 30V; .PCBCHK: USED; .Creator: F:TALI; Washability: OK; Supplier 1: Digi-Key; Supplier Part Number 1: 1727-6294-6-ND; Stock 1: 0; Pricing 1: 1=0.66, 10=0.557, 100=0.4181, 500=0.30658, 1000=0.23691 (USD); Number of Pins: 3; Weight: 0.01lb; Min Operating Temperature: -55°C; Max Operating Temperature: 150°C; Package Quantity: 1; Packaging: Tape and Reel; Max Dual Supply Voltage: 100V; Drain to Source Voltage (Vdss): 100V; Continuous Drain Current (ID): 1.9A; Drain to Source Breakdown Voltage: 100V; Power Dissipation: 2W; Drain to Source Resistance: 250mR; On-State Resistance: 250MR; Length: 3mm; Height: 1mm; Width: 1.4mm; Radiation Hardening: No; Lead Free: Lead Free; ComponentLink1URL: http://www.nxp.com/documents/data_sheet/PMV213SN.pdf; ComponentLink1Description: http://www.nxp.com/documents/data_sheet/PMV213SN.pdf; ComponentLink2URL: http://www.nxp.com/documents/data_sheet/PMV213SN.pdf?ecmp=mouser; ComponentLink2Description: http://www.nxp.com/documents/data_sheet/PMV213SN.pdf?ecmp=mouser; .SCHCHK: USED
footprint SOT23-3
pins: 1 G, 2 S, 3 D

## Q-PSMN030-60YS,115
designator Q?, comment PSMN030
MOSFET N-CH 60V 29A LFPAK; Manufacturer: Nexperia; Manufacturer Part Number: PSMN030-60YS,115; Washability: OK; .Creator: M.OZKAN; .PCBCHK: USED; RoHS: No; Supplier 1: Digi-Key; Supplier Part Number 1: 1727-4628-1-ND; Stock 1: 15240; Pricing 1: 1=0.56000, 10=0.48300, 100=0.33500, 500=0.26156 (USD); .SCHCHK: USED
footprint SOT669-LFPAK (TDSON, 8-Leads, Body 6.15x5.15mm, Pitch 1.27mm)
pins: 1 S, 2 S, 3 S, 4 G, 5 D

## Q-PUMZ1,115
designator Q?, comment Case/Package: 6TSSOP  Manufacturer Part Number: PUMZ1,115  (hidden comment: PUMZ1)
TRANS NPN/PNP 40V 0.1A 6TSSOP; Manufacturer: NXP Semiconductors; Max Power Dissipation: 200mW; Max Collector Current: 100mA; Collector Base Voltage (VCBO): 50V; Frequency: 100MHz; Polarity: NPN; Emitter Base Voltage (VEBO): 5V; Number of Elements: 2; Test Current: 5mA; Zener Voltage: 5.1V; Element Configuration: Dual; Current: 1A; Washability: OK; .Creator: M.OZKAN; .PCBCHK: USED; Supplier 1: Digi-Key; Stock 1: 0; RoHS: Yes; Mount: Surface Mount; Number of Pins: 6; Min Operating Temperature: -65°C; Max Operating Temperature: 150°C; Collector Emitter Voltage (VCEO): 40V; Package Quantity: 1; Packaging: Tape and Reel; Transition Frequency: 100MHz; Collector Emitter Breakdown Voltage: 40V; Max Breakdown Voltage: 40V; Power Dissipation: 200mW; Termination: SMD/SMT; Gain Bandwidth Product: 100MHz; Voltage: 40V; Radiation Hardening: No; REACH SVHC: No SVHC; Lead Free: Lead Free; ComponentLink1URL: https://datasheet.ciiva.com/4722/pumz1-104831-4722227.pdf?src-supplier=Mouser; ComponentLink1Description: https://datasheet.ciiva.com/4722/pumz1-104831-4722227.pdf?src-supplier=Mouser; ComponentLink2URL: https://datasheet.ciiva.com/6366/pumz1-6366963.pdf?src-supplier=Digi-Key; ComponentLink2Description: https://datasheet.ciiva.com/6366/pumz1-6366963.pdf?src-supplier=Digi-Key; ComponentLink3URL: https://datasheet.ciiva.com/968/pumz1-968100.pdf?src-supplier=Digi-Key; ComponentLink3Description: https://datasheet.ciiva.com/968/pumz1-968100.pdf?src-supplier=Digi-Key; ComponentLink4URL: https://datasheet.ciiva.com/6366/pumz1-6366965.pdf?src-supplier=Digi-Key; ComponentLink4Description: https://datasheet.ciiva.com/6366/pumz1-6366965.pdf?src-supplier=Digi-Key; ComponentLink5URL: https://datasheet.ciiva.com/1259/pimz2-pumz2-1259478.pdf?src-supplier=Newark; ComponentLink5Description: https://datasheet.ciiva.com/1259/pimz2-pumz2-1259478.pdf?src-supplier=Newark; ComponentLink6URL: https://datasheet.ciiva.com/11201/pumz1-11201527.pdf?src-supplier=Avnet; ComponentLink6Description: https://datasheet.ciiva.com/11201/pumz1-11201527.pdf?src-supplier=Avnet; ComponentLink7URL: https://datasheet.ciiva.com/16615/pumz1-16615180.pdf?src-supplier=Avnet+Europe; ComponentLink7Description: https://datasheet.ciiva.com/16615/pumz1-16615180.pdf?src-supplier=Avnet+Europe; Supplier Part Number 1: 568-6556-1-ND; .SCHCHK: USED
footprint TSSOP6(SOT363)
pins: 1, 2, 3, 4, 5, 6

## Q-RTR030N05-SOT23
designator Q?, comment RTR030N05  Case/Package: SOT23-3
MOSFET N-CH 45V 3A TSMT3; Manufacturer: Rohm; Manufacturer Part Number: RTR030N05TL; Rise Time: 19ns; Rds On Max: 67mR; Input Capacitance: 510pF; Max Power Dissipation: 1W; Drain to Source Resistance: 48mR; Turn-On Delay Time: 12ns; Turn-Off Delay Time: 34ns; Fall Time: 26ns; Element Configuration: Single; Gate to Source Voltage (Vgs): 12V; .PCBCHK: USED; .Creator: F:TALI; Washability: OK; Supplier 1: Digi-Key; Supplier Part Number 1: RTR030N05TLDKR-ND; Stock 1: 64243; Pricing 1: 1=0.61, 10=0.512, 100=0.3841, 500=0.28166, 1000=0.21765 (USD); Mount: Surface Mount; Number of Pins: 3; Min Operating Temperature: -55°C; Max Operating Temperature: 150°C; Packaging: Tape and Reel; Package Quantity: 1; Drain to Source Voltage (Vdss): 45V; Continuous Drain Current (ID): 3A; Drain to Source Breakdown Voltage: 45V; Power Dissipation: 1W; Length: 2.9mm; Height: 0.9mm; Width: 1.6mm; Radiation Hardening: No; Lead Free: Lead Free; ComponentLink1URL: http://avnetexpress.avnet.com/store/em/EMController/MOSFET/Rohm-Semiconductor/RTR030N05TL/_/R-5003358603636/A-5003358603636/rohmfs.rohm.com/en/products/databook/datasheet/discrete/transistor/mosfet/rtr030n05.pdf; ComponentLink1Description: http://avnetexpress.avnet.com/store/em/EMController/MOSFET/Rohm-Semiconductor/RTR030N05TL/_/R-5003358603636/A-5003358603636/rohmfs.rohm.com/en/products/databook/datasheet/discrete/transistor/mosfet/rtr030n05.pdf; ComponentLink2URL: http://rohmfs.rohm.com/en/products/databook/datasheet/discrete/transistor/mosfet/rtr030n05tl-e.pdf; ComponentLink2Description: http://rohmfs.rohm.com/en/products/databook/datasheet/discrete/transistor/mosfet/rtr030n05tl-e.pdf; ComponentLink3URL: http://www.mouser.com/ds/2/348/rtr030n05-208910.pdf; ComponentLink3Description: http://www.mouser.com/ds/2/348/rtr030n05-208910.pdf; ComponentLink4URL: http://datasheet.iiic.cc/rohm_semiconductor/RTR030N05TL.pdf; ComponentLink4Description: http://datasheet.iiic.cc/rohm_semiconductor/RTR030N05TL.pdf; .SCHCHK: USED
footprint SOT23-3
pins: 1 G, 2 S, 3 D

## Q-SI7113ADN-T1-GE3
designator Q?, comment SI7113ADN
MOSFET P-CH 100V 10.8A 1212-8; Manufacturer: Vishay; Manufacturer Part Number: SI7113ADN-T1-GE3; Washability: OK; .Creator: M.OZKAN; .PCBCHK: USED; Input Capacitance: 515pF; Max Power Dissipation: 27.8W; Rds On Max: 132mR; Supplier 1: Digi-Key; Stock 1: 12735; Pricing 1: 1=0.65000, 10=0.55800, 100=0.38700, 500=0.30214, 1000=0.24559 (USD); RoHS: No; ComponentLink1URL: https://www.vishay.com/docs/77678/si7113adn.pdf?src-supplier=Digi-Key; ComponentLink1Description: https://www.vishay.com/docs/77678/si7113adn.pdf?src-supplier=Digi-Key; Supplier Part Number 1: SI7113ADN-T1-GE3CT-ND; .SCHCHK: USED; Stock: 19112; Pricing: 1=0.63, 10=0.542, 25=0.5056, 100=0.3757, 500=0.2933, 1000=0.2384 (USD); Mount: Surface Mount; Min Operating Temperature: -55°C; Max Operating Temperature: 150°C; Packaging: Cut Tape; Drain to Source Voltage (Vdss): 100V; Continuous Drain Current (ID): 10.8A; ComponentLink2URL: http://www.farnell.com/datasheets/2687468.pdf?src-supplier=Farnell; ComponentLink2Description: http://www.farnell.com/datasheets/2687468.pdf?src-supplier=Farnell; ComponentLink3URL: http://www.farnell.com/datasheets/2687468.pdf?src-supplier=Element14; ComponentLink3Description: http://www.farnell.com/datasheets/2687468.pdf?src-supplier=Element14; ComponentLink4URL: http://www.farnell.com/datasheets/2687468.pdf?src-supplier=Newark; ComponentLink4Description: http://www.farnell.com/datasheets/2687468.pdf?src-supplier=Newark
footprint PowerPAK 1212-8
pins: 1 S, 2 S, 3 S, 4 G, 5 D, 6 D, 7 D, 8 D

## Q-SMMBTA42LT1G
designator Q?, comment MMBTA42  Collector Emitter Voltage (VCEO): 300V
TRANS NPN 300V 0.5A SOT23; Manufacturer: ON Semiconductor; Manufacturer Part Number: SMMBTA42LT1G; Frequency: 50MHz; Max Power Dissipation: 300mW; Emitter Base Voltage (VEBO): 6V; Max Collector Current: 500mA; Number of Elements: 1; Element Configuration: Single; .Creator: M.OZKAN; .PCBCHK: USED; Supplier 1: Mouser; Supplier Part Number 1: 863-SMMBTA42LT1G; Stock: 8842; Pricing: 1=0.41, 10=0.269, 100=0.119, 1000=0.088, 3000=0.071, 9000=0.061 (USD); RoHS: Yes; Case/Package: SOT-23-3; Number of Pins: 3; Contact Plating: Tin,Matte; Min Operating Temperature: -55°C; Max Operating Temperature: 150°C; Package Quantity: 3000; Packaging: Tape and Reel; Polarity: NPN; Collector Base Voltage (VCBO): 300V; Collector Emitter Breakdown Voltage: 300V; Transition Frequency: 50MHz; Power Dissipation: 300mW; Radiation Hardening: No; Lead Free: Lead Free; ComponentLink1URL: https://datasheet.ciiva.com/25997/mmbta42lt1-d-25997511.pdf?src-supplier=Avnet+Europe; ComponentLink1Description: https://datasheet.ciiva.com/25997/mmbta42lt1-d-25997511.pdf?src-supplier=Avnet+Europe; ComponentLink2URL: https://datasheet.ciiva.com/11204/mmbta42lt1-d-11204938.pdf?src-supplier=Avnet; ComponentLink2Description: https://datasheet.ciiva.com/11204/mmbta42lt1-d-11204938.pdf?src-supplier=Avnet; .SCHCHK: USED
footprint SOT23-3
pins: 1 B, 2 E, 3 C

## Q-SQJ402EP-T1_GE3
designator Q?, comment SQJ402EP  Continuous Drain Current (ID): 32A  Drain to Source Voltage (Vdss): 100V
MOSFET N-CH 100V POWERPAK SO8L; Manufacturer: Vishay Semiconductors; Manufacturer Part Number: SQJ402EP-T1_GE3; Rise Time: 10ns; Turn-Off Delay Time: 27ns; Fall Time: 7ns; Threshold Voltage: 2V; Max Power Dissipation: 83W; Gate to Source Voltage (Vgs): 20V; Element Configuration: Single; Number of Channels: 1; Drain to Source Resistance: 11mR; Washability: OK; .Creator: M.OZKAN; .PCBCHK: USED; Supplier 1: Digi-Key; Stock 1: 4517; Pricing 1: 1=1.43000, 10=1.27600, 100=0.90850, 500=0.77002, 1000=0.62727 (USD); RoHS: Yes; Mount: Surface Mount; Number of Pins: 8; Min Operating Temperature: -55°C; Max Operating Temperature: 175°C; Packaging: Tape and Reel; Turn-On Delay Time: 10ns; Package Quantity: 3000; Length: 4.9mm; Height: 1.07mm; Width: 4.37mm; Radiation Hardening: No; REACH SVHC: Unknown; ComponentLink1URL: https://datasheet.ciiva.com/30021/sqj402ep-30021632.pdf?src-supplier=Avnet; ComponentLink1Description: https://datasheet.ciiva.com/30021/sqj402ep-30021632.pdf?src-supplier=Avnet; Supplier Part Number 1: SQJ402EP-T1_GE3CT-ND; .SCHCHK: USED
footprint SO8L
pins: 1 S, 2 S, 3 S, 4 G, 5 D, 6 D, 7 D, 8 D

## Q-STN3N40K3
designator Q?, comment STN3N40K3  Drain to Source Breakdown Voltage: 400V  Continuous Drain Current (ID): 1.8A
MOSFET N-CH 400V 1.8A SOT223; Manufacturer: STMicroelectronics; Rise Time: 8ns; Gate to Source Voltage (Vgs): 30V; Fall Time: 14ns; Turn-On Delay Time: 7ns; Turn-Off Delay Time: 18ns; Rds On Max: 3.4R; Input Capacitance: 165pF; Max Power Dissipation: 3.3W; Number of Elements: 1; Drain to Source Resistance: 3R; Threshold Voltage: 3.75V; Element Configuration: Single; .Creator: M.OZKAN; .PCBCHK: USED; Supplier 1: Digi-Key; Supplier Part Number 1: 497-11222-1-ND; Manufacturer Part Number: STN3N40K3; Stock: 18345; Pricing: 1=0.61, 10=0.524, 25=0.4888, 100=0.3632, 250=0.345, 500=0.2836, 1000=0.2305 (USD); RoHS: Yes; Mount: Surface Mount; Case/Package: SOT-223; Number of Pins: 4; Min Operating Temperature: -55°C; Max Operating Temperature: 150°C; Package Quantity: 4000; Packaging: Tape and Reel; Drain to Source Voltage (Vdss): 400V; Power Dissipation: 3.3W; On-State Resistance: 3.4R; Length: 6.7mm; Height: 1.7mm; Width: 3.7mm; Radiation Hardening: No; Lead Free: Lead Free; REACH SVHC: No SVHC; ComponentLink1URL: https://datasheet.ciiva.com/17321/cd00278221-17321187.pdf?src-supplier=Avnet+Europe; ComponentLink1Description: https://datasheet.ciiva.com/17321/cd00278221-17321187.pdf?src-supplier=Avnet+Europe; ComponentLink2URL: https://datasheet.ciiva.com/8025/1581600-8025273.pdf?src-supplier=Element14; ComponentLink2Description: https://datasheet.ciiva.com/8025/1581600-8025273.pdf?src-supplier=Element14; ComponentLink3URL: https://datasheet.ciiva.com/4441/cd00278221-117631-4441628.pdf?src-supplier=Mouser; ComponentLink3Description: https://datasheet.ciiva.com/4441/cd00278221-117631-4441628.pdf?src-supplier=Mouser; ComponentLink4URL: https://datasheet.ciiva.com/25625/0900766b810ea1b2-25625599.pdf?src-supplier=RSComponents; ComponentLink4Description: https://datasheet.ciiva.com/25625/0900766b810ea1b2-25625599.pdf?src-supplier=RSComponents; ComponentLink5URL: https://datasheet.ciiva.com/938/cd00278221-938465.pdf?src-supplier=Digi-Key; ComponentLink5Description: https://datasheet.ciiva.com/938/cd00278221-938465.pdf?src-supplier=Digi-Key; ComponentLink6URL: https://datasheet.ciiva.com/938/cd00278221-938467.pdf?src-supplier=Digi-Key; ComponentLink6Description: https://datasheet.ciiva.com/938/cd00278221-938467.pdf?src-supplier=Digi-Key; ComponentLink7URL: https://datasheet.ciiva.com/16491/cd00278221-16491206.pdf?src-supplier=Future+Electronics; ComponentLink7Description: https://datasheet.ciiva.com/16491/cd00278221-16491206.pdf?src-supplier=Future+Electronics; .SCHCHK: USED
footprint SOT223 (SOT,2.30mm pitch;4 pin,3.50mm W X 6.50mm L X 1.70mm H body)
pins: 1 G, 2 D, 3 S, 4 D

## Q-STP55NF06L-TO220
designator Q?, comment STP55NF06L  Case/Package: TO-220
MOSFET N-CH 60V 55A TO-220; Manufacturer: STMicroelectronics; Rds On Max: 18mR; Input Capacitance: 1.7nF; Number of Elements: 1; Max Power Dissipation: 95W; Rise Time: 100ns; Nominal Vgs: 1.7V; Fall Time: 20ns; Drain to Source Resistance: 14mR; Turn-Off Delay Time: 40ns; Element Configuration: Single; Gate to Source Voltage (Vgs): 16V; .PCBCHK: USED; .Creator: F:TALI; Washability: OK; Supplier 1: Digi-Key; Supplier Part Number 1: 497-6742-5-ND; Manufacturer Part Number: STP55NF06L; Stock 1: 0; Pricing 1: 1=1.73, 50=1.3946, 100=1.2551, 500=0.97616, 1000=0.80882 (USD); Mount: Through Hole; Number of Pins: 3; Weight: 0.01lb; Min Operating Temperature: -55°C; Max Operating Temperature: 175°C; Package Quantity: 50; Packaging: Rail/Tube; Drain to Source Voltage (Vdss): 60V; Continuous Drain Current (ID): 55A; Drain to Source Breakdown Voltage: 60V; Power Dissipation: 95W; Turn-On Delay Time: 20ns; Threshold Voltage: 1.7V; Voltage Rating (DC): 60V; Current Rating: 55A; On-State Resistance: 18mR; Length: 10.4mm; Height: 9.15mm; Width: 4.6mm; Radiation Hardening: No; REACH SVHC: No SVHC; Lead Free: Lead Free; ComponentLink1URL: http://www.st.com/content/ccc/resource/technical/document/datasheet/49/c5/a8/71/93/60/4f/86/CD00002690.pdf/files/CD00002690.pdf/jcr:content/translations/en.CD00002690.pdf; ComponentLink1Description: http://www.st.com/content/ccc/resource/technical/document/datasheet/49/c5/a8/71/93/60/4f/86/CD00002690.pdf/files/CD00002690.pdf/jcr:content/translations/en.CD00002690.pdf; ComponentLink2URL: http://www.farnell.com/datasheets/129279.pdf; ComponentLink2Description: http://www.farnell.com/datasheets/129279.pdf; ComponentLink3URL: http://www.st.com/web/en/resource/technical/document/datasheet/CD00002690.pdf; ComponentLink3Description: http://www.st.com/web/en/resource/technical/document/datasheet/CD00002690.pdf; .SCHCHK: USED
footprint TO-220AB
footprint TO-220_OUTLINE
footprint TO-220AB-H
pins: 1 G, 2 D, 3 S

## Q-SUD50P06
designator Q?, comment SUD50P06  Gate to Source Voltage (Vgs): 20V
MOSFET P-CH 60V 50A TO-252; Manufacturer: Vishay Siliconix; Manufacturer Part Number: SUD50P06-15-GE3; Rds On Max: 15mR; Input Capacitance: 4.95nF; Rise Time: 70ns; Max Power Dissipation: 2.5W; Fall Time: 175ns; Threshold Voltage: -3V; Number of Elements: 1; Turn-On Delay Time: 15ns; Element Configuration: Single; Drain to Source Breakdown Voltage: -60V; .Creator: F:TALI; .PCBCHK: USED; Washability: OK; Supplier 1: Digi-Key; Supplier Part Number 1: SUD50P06-15-GE3DKR-ND; Stock 1: 17302; Pricing 1: 1=2.57, 10=2.319, 100=1.8637, 500=1.44958, 1000=1.20108 (USD); Mount: Surface Mount; Case/Package: DPAK; Number of Pins: 3; Weight: 0.050717oz; Contact Plating: Matte,Tin; Min Operating Temperature: -55°C; Max Operating Temperature: 150°C; Package Quantity: 1; Packaging: Tape and Reel; Drain to Source Voltage (Vdss): 60V; Continuous Drain Current (ID): 50A; Drain to Source Resistance: 15mR; Turn-Off Delay Time: 175ns; Power Dissipation: 2.5W; Number of Channels: 1; On-State Resistance: 15mR; Length: 6.73mm; Height: 2.39mm; Width: 6.22mm; Radiation Hardening: No; REACH SVHC: No SVHC; Lead Free: Lead Free; ComponentLink1URL: http://www.vishay.com/docs/68940/sud50p06.pdf?src-supplier=Digi-Key; ComponentLink1Description: http://www.vishay.com/docs/68940/sud50p06.pdf?src-supplier=Digi-Key; ComponentLink2URL: http://www.farnell.com/datasheets/2049645.pdf?src-supplier=Element14; ComponentLink2Description: http://www.farnell.com/datasheets/2049645.pdf?src-supplier=Element14; ComponentLink3URL: http://www.mouser.com/ds/2/427/sud50p06-244530.pdf?src-supplier=Mouser; ComponentLink3Description: http://www.mouser.com/ds/2/427/sud50p06-244530.pdf?src-supplier=Mouser; ComponentLink4URL: http://www.vishay.com/docs/68940/sud50p06.pdf?src-supplier=Farnell; ComponentLink4Description: http://www.vishay.com/docs/68940/sud50p06.pdf?src-supplier=Farnell; ComponentLink5URL: http://www.vishay.com/docs/68940/sud50p06.pdf?src-supplier=Avnet; ComponentLink5Description: http://www.vishay.com/docs/68940/sud50p06.pdf?src-supplier=Avnet; ComponentLink6URL: http://www.vishay.com/docs/68940/sud50p06.pdf?src-supplier=Avnet+Europe; ComponentLink6Description: http://www.vishay.com/docs/68940/sud50p06.pdf?src-supplier=Avnet+Europe; ComponentLink7URL: http://www.vishay.com/docs/68940/sud50p06.pdf?src-supplier=Future+Electronics; ComponentLink7Description: http://www.vishay.com/docs/68940/sud50p06.pdf?src-supplier=Future+Electronics; ComponentLink8URL: http://datasheet.iiic.cc/vishay_[siliconix]/SUD50P06-15-GE3.pdf?src-supplier=IIIC; ComponentLink8Description: http://datasheet.iiic.cc/vishay_[siliconix]/SUD50P06-15-GE3.pdf?src-supplier=IIIC; .SCHCHK: USED
footprint D2PAK-TO-263
pins: 1 G, 2 S, 3 D